# Altium footprint library 1.08-LED发光二极管.PcbLib: 72 footprints (part 3 of 5)
Each footprint in its own frame and in the unit in brackets; x right, y up, seen from the top. Pads: shape width x height; smd on the part's side, far side on the other; paste and mask are expansions set on the pad; w line width, h text height; cw(c..) or ccw(c..) is an arc to the next point about the centre after c.
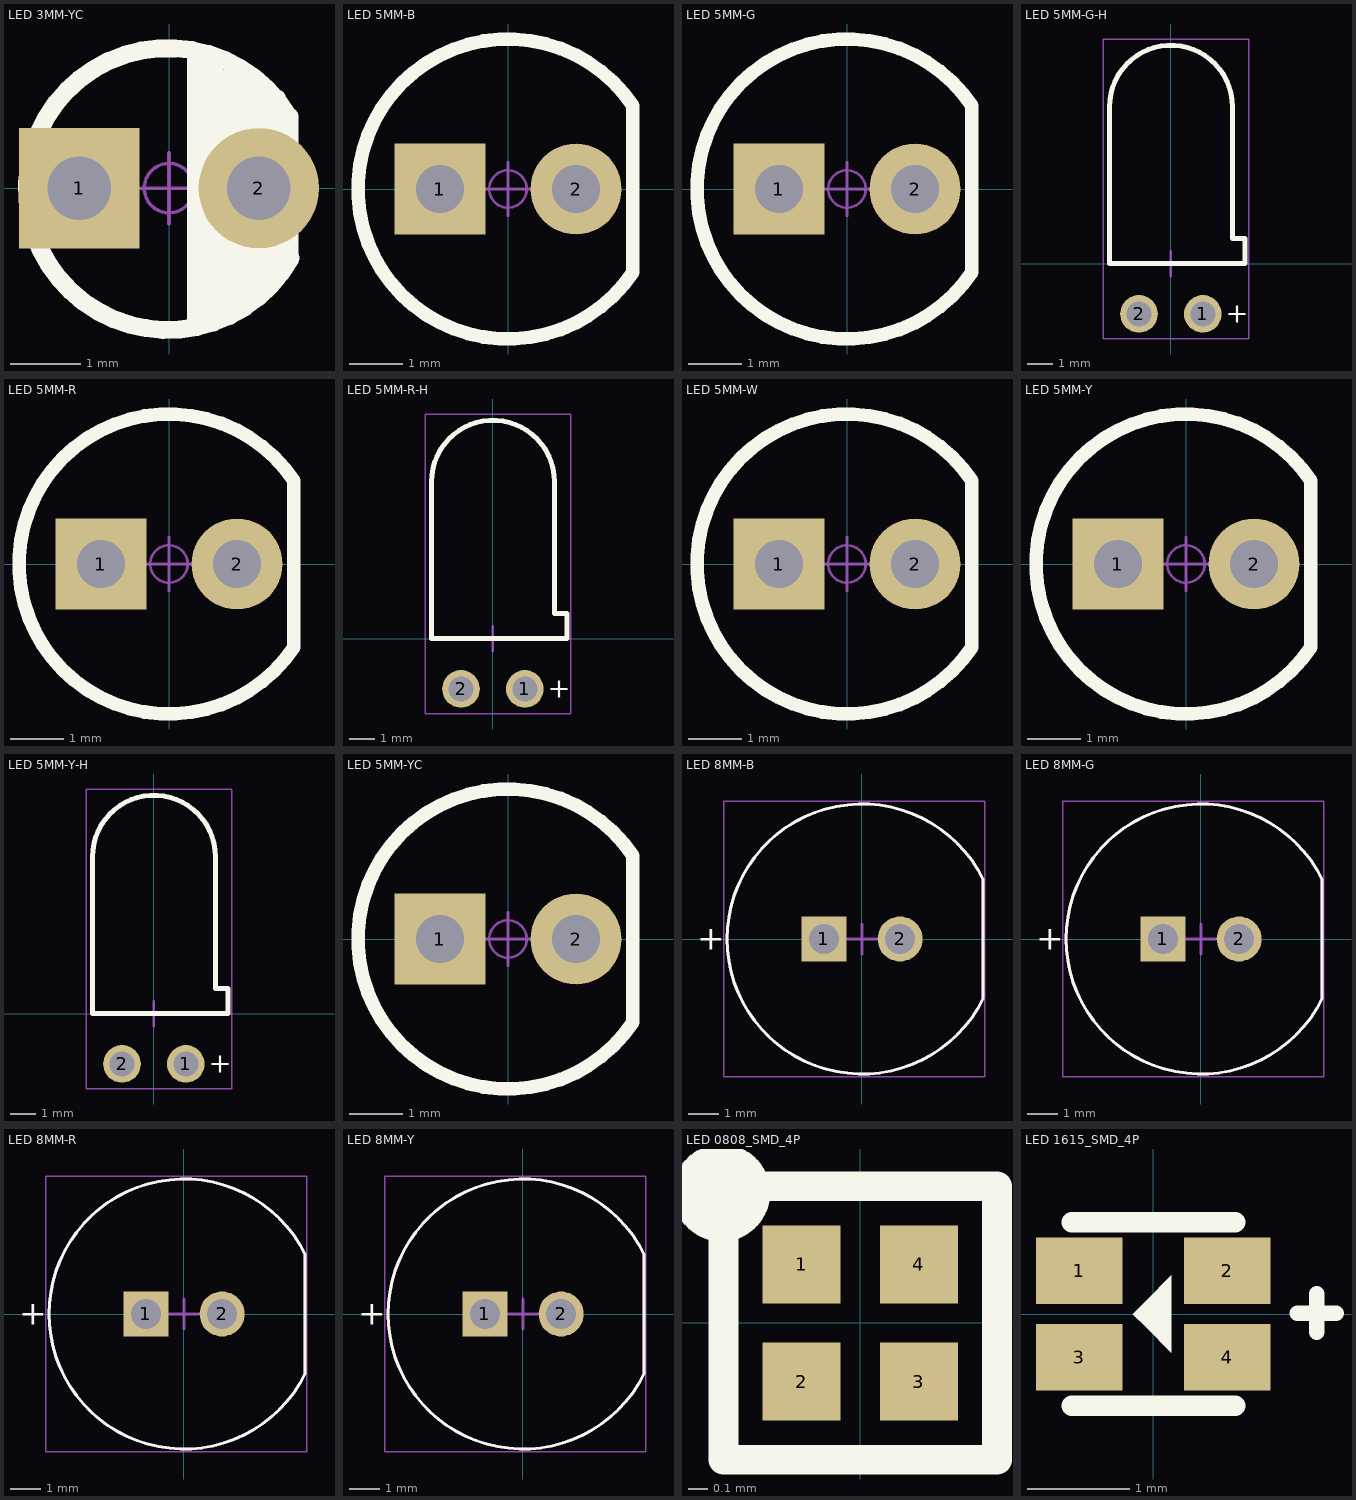
[diagram p2: the footprints below, top view; thin cyan lines are the x and y axes]

## LED 3MM-YC [mm] "橙色3mm直插LED                        联系卖家 免费查找封装"
height 6.35
pads (2):
  rect 1.7x1.7 hole 0.9: 1(-1.27,0)
  round 1.7 hole 0.9: 2(1.27,0)
Top Overlay:
  lines w0.254: 0.381,-1.905 0.381,1.905 ; 0.635,-1.778 0.635,1.778 ; 0.889,-1.778 0.889,1.651 1.016,1.524 ; 1.016,-1.651 1.016,1.524 ; 1.524,1.27 1.524,-1.27 1.27,-1.524 1.27,1.397 1.143,1.524 1.016,1.524 ; 1.685,1.025 ccw(c-0.016,-0.012) 1.72,-0.987 ; 1.702,-0.965 1.702,1.016
Mechanical 15:
  circle w0.05: c0,0 r0.35
  lines w0.05: -0.5,0 0.5,0 ; 0,-0.5 0,0.5
3D body: height 3, standoff -3.45, extent -1.623,-0.838 1.618,0.838
3D body: height 5.55, standoff 0.05, extent -1.95,-1.95 1.638,1.95

## LED 5MM-B [mm] "蓝色5mm直插LED                           淘宝卖家ID:黄晶宝石"
height 10.16
pads (2):
  rect 1.7x1.7 hole 0.9: 1(-1.27,0)
  round 1.7 hole 0.9: 2(1.27,0)
Top Overlay:
  lines w0.254: 2.33,-1.553 cw(c0,0) 2.33,1.553 2.33,-1.553
Mechanical 15:
  circle w0.05: c0,0 r0.35
  lines w0.05: -0.5,0 0.5,0 ; 0,-0.5 0,0.5
3D body: height 4.5, standoff -3.45, extent -1.998,-0.8 2.062,0.8
3D body: height 8.75, standoff 0.05, extent -2.85,-2.85 2.454,2.85

## LED 5MM-G [mm] "绿色5mm直插LED                           淘宝卖家ID:黄晶宝石"
height 10.16
pads (2):
  rect 1.7x1.7 hole 0.9: 1(-1.27,0)
  round 1.7 hole 0.9: 2(1.27,0)
Top Overlay:
  lines w0.254: 2.33,-1.553 cw(c0,0) 2.33,1.553 2.33,-1.553
Mechanical 15:
  circle w0.05: c0,0 r0.35
  lines w0.05: -0.5,0 0.5,0 ; 0,-0.5 0,0.5
3D body: height 8.75, standoff 0.05, extent -2.85,-2.85 2.454,2.85
3D body: height 4.5, standoff -3.45, extent -1.998,-0.8 2.062,0.8

## LED 5MM-G-H [mm] "绿色5mm直插LED  卧式安装"
height 5
pads (2):
  round 1.5 hole 1: 1(1.27,-2) 2(-1.27,-2)
Top Overlay:
  lines w0.2: -2.45,0 -2.45,6.25 cw(c0,6.25) 2.45,6.25 2.45,1 2.95,1 2.95,0 -2.45,0
  text "+" at 3.1,-2.362 h0.8
Mechanical 13:
  lines w0.1: -2.45,0 -2.45,6.25 cw(c0,6.25) 2.45,6.25 2.45,1 2.95,1 2.95,0 -2.45,0
Mechanical 15:
  lines w0.05: -2.7,-3 3.1,-3 3.1,8.95 -2.7,8.95 -2.7,-3
  lines w0.1: -0.5,0 0.5,0 ; 0,-0.5 0,0.5
3D body: height 5.95, standoff -3.2, extent -2.45,-2.25 2.95,8.7

## LED 5MM-R [mm] "红色5mm直插LED                           淘宝卖家ID:黄晶宝石"
height 10.16
pads (2):
  rect 1.7x1.7 hole 0.9: 1(-1.27,0)
  round 1.7 hole 0.9: 2(1.27,0)
Top Overlay:
  lines w0.254: 2.33,-1.553 cw(c0,0) 2.33,1.553 2.33,-1.553
Mechanical 15:
  circle w0.05: c0,0 r0.35
  lines w0.05: -0.5,0 0.5,0 ; 0,-0.5 0,0.5
3D body: height 8.75, standoff 0.05, extent -2.85,-2.85 2.454,2.85
3D body: height 4.5, standoff -3.45, extent -1.998,-0.8 2.062,0.8

## LED 5MM-R-H [mm] "红色5mm直插LED  卧式安装"
height 5
pads (2):
  round 1.5 hole 1: 1(1.27,-2) 2(-1.27,-2)
Top Overlay:
  lines w0.2: -2.45,0 -2.45,6.25 cw(c0,6.25) 2.45,6.25 2.45,1 2.95,1 2.95,0 -2.45,0
  text "+" at 3.1,-2.362 h0.8
Mechanical 13:
  lines w0.1: -2.45,0 -2.45,6.25 cw(c0,6.25) 2.45,6.25 2.45,1 2.95,1 2.95,0 -2.45,0
Mechanical 15:
  lines w0.05: -2.7,-3 3.1,-3 3.1,8.95 -2.7,8.95 -2.7,-3
  lines w0.1: -0.5,0 0.5,0 ; 0,-0.5 0,0.5
3D body: height 5.95, standoff -3.2, extent -2.45,-2.25 2.95,8.7

## LED 5MM-W [mm] "白色5mm直插LED                           淘宝卖家ID:黄晶宝石"
height 10.16
pads (2):
  rect 1.7x1.7 hole 0.9: 1(-1.27,0)
  round 1.7 hole 0.9: 2(1.27,0)
Top Overlay:
  lines w0.254: 2.33,-1.553 cw(c0,0) 2.33,1.553 2.33,-1.553
Mechanical 15:
  circle w0.05: c0,0 r0.35
  lines w0.05: -0.5,0 0.5,0 ; 0,-0.5 0,0.5
3D body: height 8.75, standoff 0.05, extent -2.85,-2.85 2.454,2.85
3D body: height 4.5, standoff -3.45, extent -1.998,-0.8 2.062,0.8

## LED 5MM-Y [mm] "黄色5mm直插LED                           淘宝卖家ID:黄晶宝石"
pads (2):
  rect 1.7x1.7 hole 0.9: 1(-1.27,0)
  round 1.7 hole 0.9: 2(1.27,0)
Top Overlay:
  lines w0.254: 2.33,-1.553 cw(c0,0) 2.33,1.553 2.33,-1.553
Mechanical 15:
  circle w0.05: c0,0 r0.35
  lines w0.05: -0.5,0 0.5,0 ; 0,-0.5 0,0.5
3D body: height 8.75, standoff 0.05, extent -2.85,-2.85 2.454,2.85
3D body: height 4.5, standoff -3.45, extent -1.998,-0.8 2.062,0.8

## LED 5MM-Y-H [mm] "黄色5mm直插LED 卧式安装                淘宝卖家ID:黄晶宝石"
height 5
pads (2):
  round 1.5 hole 1: 1(1.27,-2) 2(-1.27,-2)
Top Overlay:
  lines w0.2: -2.45,0 -2.45,6.25 cw(c0,6.25) 2.45,6.25 2.45,1 2.95,1 2.95,0 -2.45,0
  text "+" at 3.1,-2.362 h0.8
Mechanical 13:
  lines w0.1: -2.45,0 -2.45,6.25 cw(c0,6.25) 2.45,6.25 2.45,1 2.95,1 2.95,0 -2.45,0
Mechanical 15:
  lines w0.05: -2.7,-3 3.1,-3 3.1,8.95 -2.7,8.95 -2.7,-3
  lines w0.1: -0.5,0 0.5,0 ; 0,-0.5 0,0.5
3D body: height 5.95, standoff -3.2, extent -2.45,-2.25 2.95,8.7

## LED 5MM-YC [mm] "橙色5mm直插LED                           淘宝卖家ID:黄晶宝石"
pads (2):
  rect 1.7x1.7 hole 0.9: 1(-1.27,0)
  round 1.7 hole 0.9: 2(1.27,0)
Top Overlay:
  lines w0.254: 2.33,-1.553 cw(c0,0) 2.33,1.553 2.33,-1.553
Mechanical 15:
  circle w0.05: c0,0 r0.35
  lines w0.05: -0.5,0 0.5,0 ; 0,-0.5 0,0.5
3D body: height 8.75, standoff 0.05, extent -2.85,-2.85 2.454,2.85
3D body: height 4.5, standoff -3.45, extent -1.998,-0.8 2.062,0.8

## LED 8MM-B [mm] "蓝色8mm直插LED                淘宝卖家ID:黄晶宝石"
height 10.16
pads (2):
  rect 1.5x1.5 hole 1: 1(-1.27,0)
  round 1.5 hole 1: 2(1.27,0)
Top Overlay:
  lines w0.1: 4.03,-2.002 cw(c0,0) 4.03,2.003 4.03,-2.002
  text "+" at -5.5,-0.35 h0.8
Mechanical 13:
  lines w0.1: 4.03,-2.002 cw(c0,0) 4.03,2.002 4.03,-2.002
Mechanical 15:
  lines w0.05: -4.6,-4.6 -4.6,4.6 4.1,4.6 4.1,-4.6 -4.6,-4.6
  lines w0.1: -0.5,0 0.5,0 ; 0,-0.5 0,0.5
3D body: height 11.3, standoff -30.7, extent -4.5,-4.5 4.03,4.5

## LED 8MM-G [mm] "绿色8mm直插LED"
height 10.16
pads (2):
  rect 1.5x1.5 hole 1: 1(-1.27,0)
  round 1.5 hole 1: 2(1.27,0)
Top Overlay:
  lines w0.1: 4.03,-2.002 cw(c0,0) 4.03,2.003 4.03,-2.002
  text "+" at -5.5,-0.35 h0.8
Mechanical 13:
  lines w0.1: 4.03,-2.002 cw(c0,0) 4.03,2.002 4.03,-2.002
Mechanical 15:
  lines w0.05: -4.6,-4.6 4.1,-4.6 4.1,4.6 -4.6,4.6 -4.6,-4.6
  lines w0.1: -0.5,0 0.5,0 ; 0,-0.5 0,0.5
3D body: height 11.3, standoff -30.7, extent -4.5,-4.5 4.03,4.5

## LED 8MM-R [mm] "红色8mm直插LED            联系卖家 免费查找封装"
height 10.16
pads (2):
  rect 1.5x1.5 hole 1: 1(-1.27,0)
  round 1.5 hole 1: 2(1.27,0)
Top Overlay:
  lines w0.1: 4.03,-2.002 cw(c0,0) 4.03,2.003 4.03,-2.002
  text "+" at -5.5,-0.35 h0.8
Mechanical 13:
  lines w0.1: 4.03,-2.002 cw(c0,0) 4.03,2.002 4.03,-2.002
Mechanical 15:
  lines w0.05: -4.6,-4.6 4.1,-4.6 4.1,4.6 -4.6,4.6 -4.6,-4.6
  lines w0.1: -0.5,0 0.5,0 ; 0,-0.5 0,0.5
3D body: height 11.3, standoff -30.7, extent -4.5,-4.5 4.03,4.5

## LED 8MM-Y [mm] "黄色8mm直插LED"
height 10.16
pads (2):
  rect 1.5x1.5 hole 1: 1(-1.27,0)
  round 1.5 hole 1: 2(1.27,0)
Top Overlay:
  lines w0.1: 4.03,-2.002 cw(c0,0) 4.03,2.003 4.03,-2.002
  text "+" at -5.5,-0.35 h0.8
Mechanical 13:
  lines w0.1: 4.03,-2.002 cw(c0,0) 4.03,2.002 4.03,-2.002
Mechanical 15:
  lines w0.05: -4.6,-4.6 -4.6,4.6 4.1,4.6 4.1,-4.6 -4.6,-4.6
  lines w0.1: -0.5,0 0.5,0 ; 0,-0.5 0,0.5
3D body: height 11.3, standoff -30.7, extent -4.5,-4.5 4.03,4.5

## LED 0808_SMD_4P [mm]
pads (4):
  rect 0.4x0.4 smd mask+0.076: 1(-0.3,0.3) 2(-0.3,-0.3) 3(0.3,-0.3) 4(0.3,0.3)
Top Overlay:
  circle w0.25: c-0.711,0.667 r0.125
  lines w0.152: -0.7,-0.7 0.7,-0.7 0.7,0.7 -0.7,0.7 -0.7,-0.7

## LED 1615_SMD_4P [mm] "封装来自淘宝卖家ID:黄晶宝石"
pads (4):
  rect 0.85x0.65 smd: 1(-0.725,0.425) 2(0.725,0.425) 3(-0.725,-0.425) 4(0.725,-0.425)
Top Overlay:
  region: -0.203,0 -0.076,0.127 0.178,0.381 0.178,-0.381 -0.076,-0.127
  lines w0.152: 1.409,0.009 1.79,0.009 ; 1.6,-0.181 1.6,0.2
  lines w0.203: -0.8,-0.9 0.8,-0.9 ; -0.8,0.9 0.8,0.9
3D body: height 0.51, standoff 0, extent -0.8,-0.75 0.8,0.75